# Altium footprint library mainLib.PcbLib: 169 footprints (part 6 of 11)
Each footprint in its own frame and in the unit in brackets; x right, y up, seen from the top. Pads: shape width x height; smd on the part's side, far side on the other; paste and mask are expansions set on the pad; w line width, h text height; cw(c..) or ccw(c..) is an arc to the next point about the centre after c.
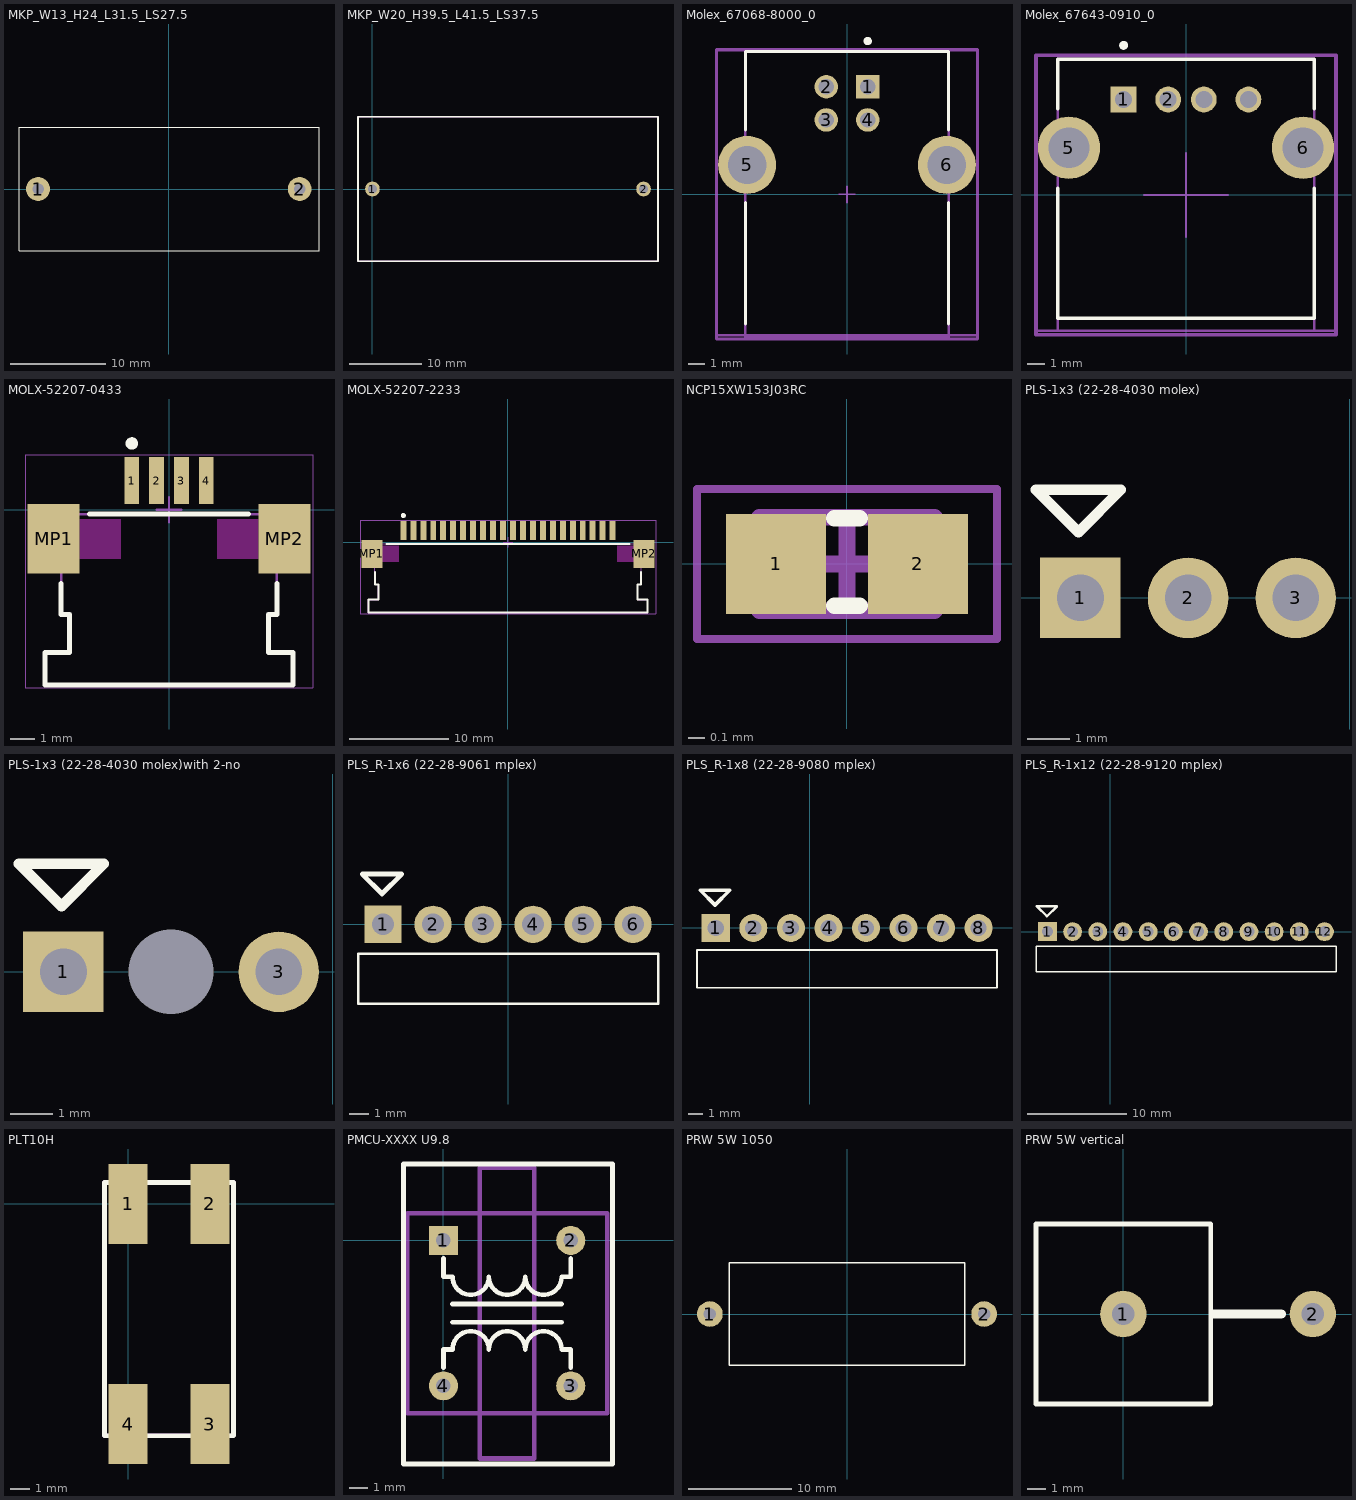
[diagram p5: the footprints below, top view; thin cyan lines are the x and y axes]

## MKP_W13_H24_L31.5_LS27.5 [mm]
pads (2):
  round 2.5 hole 1.2: 1(-13.735,0) 2(13.735,0)
Top Overlay:
  lines w0.127: -15.735,-6.5 -15.735,6.5 15.765,6.5 15.765,-6.5 -15.735,-6.5
3D body "MKP 31.5x13 h24 R27.5.STEP": height 24, standoff -2.54, extent -15.765,-6.5 15.735,6.5

## MKP_W20_H39.5_L41.5_LS37.5 [mil]
pads (2):
  round 80 hole 50: 1(0,0) 2(1476.38,0)
Top Overlay:
  lines w10: -78.74,-393.7 -78.74,-19.74 -78.74,393.7 1555.12,393.7 1555.12,-393.7 -78.74,-393.7
Mechanical 13:
  lines w10: -78.74,-393.7 -78.74,19.74 -78.74,393.7 1555.12,393.7 1555.12,-393.7 -78.74,-393.7
3D body: height 1555.12, standoff 0, extent -83.74,-398.7 1560.12,398.7

## Molex_67068-8000_0 [mm]
pads (6):
  rect 1.42x1.42 hole 0.92 paste-1000 mask+0: 1(1.25,6.49)
  round 1.42 hole 0.92 paste-1000 mask+0: 2(-1.25,6.49) 3(-1.25,4.49) 4(1.25,4.49)
  round 3.5 hole 2.3 paste-1000 mask+0: 5(-6.02,1.78) 6(6.02,1.78)
Top Overlay:
  circle w0.25: c1.25,9.25 r0.125
  lines w0.2: -6.125,-7.8 -6.125,-0.5 ; -6.125,3.905 -6.125,8.625 6.125,8.625 6.125,3.905 ; 6.125,-7.8 6.125,-0.5
Mechanical 10:
  lines w0.2: -7.87,-8.725 -7.87,8.725 7.87,8.725 7.87,-8.725 -7.87,-8.725
  text ".Designator" at 0,0 h1
Mechanical 12:
  lines w0.15: -7.87,-8.5 7.87,-8.5 ; -6.125,-8.625 -6.125,8.625 6.125,8.625 6.125,-8.625 -6.125,-8.625
Mechanical 15:
  lines w0.1: -0.5,0 0.5,0 ; 0,-0.5 0,0.5
  lines w0.2: -7.87,-8.725 -7.87,8.725 7.87,8.725 7.87,-8.725 -7.87,-8.725
3D body "Conn_Molex_67068-8000_eec.STEP": height 0.25, standoff 0, extent -7.87,-8.725 7.87,8.725

## Molex_67643-0910_0 [mm]
pads (6):
  rect 1.45x1.45 hole 0.95 paste-1000 mask+0: 1(-3.5,5.36)
  round 1.45 hole 0.95 paste-1000 mask+0: 2(-1,5.36) ""(1,5.36) ""(3.5,5.36)
  round 3.5 hole 2.3 paste-1000 mask+0: 5(-6.57,2.65) 6(6.57,2.65)
Top Overlay:
  circle w0.25: c-3.5,8.4 r0.125
  lines w0.2: -7.2,0.37 -7.2,-6.93 7.2,-6.93 7.2,0.37 ; -7.2,4.83 -7.2,7.63 7.2,7.63 7.2,4.83
Mechanical 10:
  lines w0.2: -8.42,-7.855 -8.42,7.855 8.42,7.855 8.42,-7.855 -8.42,-7.855
  text ".Designator" at 0,0 h1
Mechanical 12:
  lines w0.15: -8.42,-7.63 8.42,-7.63 ; -7.2,-7.63 -7.2,7.63 7.2,7.63 7.2,-7.63 -7.2,-7.63
Mechanical 15:
  lines w0.1: -2.357,0 2.357,0 ; 0,-2.357 0,2.357
  lines w0.2: -8.42,-7.855 -8.42,7.855 8.42,7.855 8.42,-7.855 -8.42,-7.855
3D body "3dmodel.step": height 0.25, standoff 0, extent -8.42,-7.855 8.42,7.855

## MOLX-52207-0433 [mm] "FPC Connector, 4-Leads, Right Angle, Pitch 1.0 mm, Mated Height 2.7 mm, SMT"
height 2.712
pads (6):
  rect 0.6x1.9 smd: 1(-1.5,1.175) 2(-0.5,1.175) 3(0.5,1.175) 4(1.5,1.175)
  rect 2.1x2.8 smd: MP1(-4.65,-1.175) MP2(4.65,-1.175)
Top Overlay:
  circle w0.25: c-1.5,2.675 r0.125
  lines w0.2: -4.35,-2.975 -4.35,-4.225 ; -3.2,-0.175 3.2,-0.175 ; 4.35,-2.975 4.35,-4.225 ; -4.35,-4.225 -4.013,-4.225 -4.012,-4.225 -4.012,-5.765 -5,-5.765 -5,-7.075 5,-7.075 5,-5.765 4.012,-5.765 4.012,-4.225 4.013,-4.225 4.35,-4.225 ; -4.35,-4.225 -4.35,-4.225 ; 4.35,-4.225 4.35,-4.225
Keep-Out Layer:
  region: -3.6,-0.375 -1.95,-0.375 -1.95,-1.975 -3.6,-1.975
  region: 3.6,-0.375 1.95,-0.375 1.95,-1.975 3.6,-1.975
Mechanical 13:
  lines w0.1: -5.15,-2.175 -5.15,-0.175 5.15,-0.175 5.15,-2.175 4.35,-2.175 4.35,-4.225 4.012,-4.225 4.012,-5.765 5,-5.765 5,-7.075 -5,-7.075 -5,-5.765 -4.012,-5.765 -4.012,-4.225 -4.35,-4.225 -4.35,-2.175 -5.15,-2.175
Mechanical 15:
  lines w0.05: -5.8,-7.175 -5.8,2.225 5.8,2.225 5.8,-7.175 -5.8,-7.175
  lines w0.1: -0.5,0 0.5,0 ; 0,-0.5 0,0.5
3D body "522070433.stp": height 2.71, standoff 0.01, extent -5.15,-7.075 5.15,1.825

## MOLX-52207-2233 [mm] "FPC Connector, 22-Leads, Right Angle, Pitch 1.0 mm, Mated Height 2.7 mm, SMT"
height 2.712
pads (24):
  rect 0.6x1.9 smd: 1(-10.5,1.175) 2(-9.5,1.175) 3(-8.5,1.175) 4(-7.5,1.175) 5(-6.5,1.175) 6(-5.5,1.175) 7(-4.5,1.175) 8(-3.5,1.175) 9(-2.5,1.175) 10(-1.5,1.175) 11(-0.5,1.175) 12(0.5,1.175) 13(1.5,1.175) 14(2.5,1.175) 15(3.5,1.175) 16(4.5,1.175) 17(5.5,1.175) 18(6.5,1.175) 19(7.5,1.175) 20(8.5,1.175) 21(9.5,1.175) 22(10.5,1.175)
  rect 2.1x2.8 smd: MP1(-13.65,-1.175) MP2(13.65,-1.175)
Top Overlay:
  circle w0.25: c-10.5,2.675 r0.125
  lines w0.2: -13.35,-2.975 -13.35,-4.225 -13.013,-4.225 -13.012,-5.765 -14,-5.765 -14,-7.075 14,-7.075 14,-5.765 13.012,-5.765 13.012,-4.225 13.35,-4.225 13.35,-2.975 ; -12.2,-0.175 12.2,-0.175
Keep-Out Layer:
  region: 12.6,-0.375 10.95,-0.375 10.95,-1.975 12.6,-1.975
  region: -12.6,-0.375 -10.95,-0.375 -10.95,-1.975 -12.6,-1.975
Mechanical 13:
  lines w0.1: -14.15,-2.175 -13.35,-2.175 -13.35,-4.225 -13.012,-4.225 -13.012,-5.765 -14,-5.765 -14,-7.075 14,-7.075 14,-5.765 13.012,-5.765 13.012,-4.225 13.35,-4.225 13.35,-2.175 14.15,-2.175 14.15,-0.175 -14.15,-0.175 -14.15,-2.175
Mechanical 15:
  lines w0.05: -14.8,-7.175 14.8,-7.175 14.8,2.225 -14.8,2.225 -14.8,-7.175
  lines w0.1: -0.5,0 0.5,0 ; 0,-0.5 0,0.5
3D body "522072233.stp": height 2.71, standoff 0.01, extent -14.15,-7.075 14.15,1.825

## NCP15XW153J03RC [mm]
height 0.56
pads (2):
  rect 0.6x0.6 smd: 1(-0.425,0) 2(0.425,0)
Top Overlay:
  lines w0.1: -0.075,-0.25 0.075,-0.25 ; -0.075,0.275 0.075,0.275
Mechanical 13:
  lines w0.1: -0.525,-0.28 0.525,-0.28 0.525,0.28 -0.525,0.28 -0.525,-0.28
Mechanical 15:
  lines w0.05: -0.9,-0.45 0.9,-0.45 0.9,0.45 -0.9,0.45 -0.9,-0.45
  lines w0.1: -0.28,0 0.28,0 ; 0,-0.28 0,0.28
3D body "NCP15XW153J03RC.step": height 0.56, standoff 0, extent -0.525,-0.28 0.525,0.28

## PLS-1x3 (22-28-4030 molex) [mm]
pads (3):
  rect 1.9x1.9 hole 1.1: 1(-6.35,0)
  round 1.9 hole 1.1: 2(-3.81,0) 3(-1.27,0)
Top Overlay:
  lines w0.254: -7.4,2.55 -5.4,2.55 -6.4,1.55 -7.4,2.55
3D body "022284030.stp": height 8.39, standoff -3.16, extent -7.62,-1.244 0,1.245

## PLS-1x3 (22-28-4030 molex)with 2-no [mm]
pads (3):
  rect 1.9x1.9 hole 1.1: 1(-6.35,0)
  round 0 hole 2 unplated: 2(-3.81,0)
  round 1.9 hole 1.1: 3(-1.27,0)
Top Overlay:
  lines w0.254: -7.4,2.55 -6.4,1.55 -5.4,2.55 -7.4,2.55
3D body "022284030.stp": height 8.39, standoff -3.16, extent -7.62,-1.244 0,1.245

## PLS_R-1x6 (22-28-9061 mplex) [mm]
pads (6):
  rect 1.9x1.9 hole 1.1: 1(-6.35,0)
  round 1.9 hole 1.1: 2(-3.81,0) 3(-1.27,0) 4(1.27,0) 5(3.81,0) 6(6.35,0)
Top Overlay:
  lines w0.127: -7.62,-4.04 7.62,-4.04 7.62,-1.5 -7.62,-1.5 -7.62,-4.04
  lines w0.254: -7.4,2.55 -6.4,1.55 -5.4,2.55 -7.4,2.55
3D body "022289061.stp": height 2.5, standoff -3.42, extent -7.62,-12.293 7.62,0.521

## PLS_R-1x8 (22-28-9080 mplex) [mm]
pads (8):
  rect 1.9x1.9 hole 1.1: 1(-6.35,0)
  round 1.9 hole 1.1: 2(-3.81,0) 3(-1.27,0) 4(1.27,0) 5(3.81,0) 6(6.35,0) 7(8.89,0) 8(11.43,0)
Top Overlay:
  lines w0.127: -7.62,-4.04 -7.62,-1.5 12.675,-1.5 12.675,-4.04 -7.62,-4.04
  lines w0.254: -7.4,2.55 -6.4,1.55 -5.4,2.55 -7.4,2.55
3D body "022289080.stp": height 2.5, standoff -3.42, extent -7.62,-10.261 12.7,0.521

## PLS_R-1x12 (22-28-9120 mplex) [mm]
pads (12):
  rect 1.9x1.9 hole 1.1: 1(-6.35,0)
  round 1.9 hole 1.1: 2(-3.81,0) 3(-1.27,0) 4(1.27,0) 5(3.81,0) 6(6.35,0) 7(8.89,0) 8(11.43,0) 9(13.97,0) 10(16.51,0) 11(19.05,0) 12(21.59,0)
Top Overlay:
  lines w0.127: -7.5,-4.04 -7.5,-1.5 22.75,-1.5 22.75,-4.04 -7.5,-4.04
  lines w0.254: -7.4,2.55 -6.4,1.55 -5.4,2.55 -7.4,2.55
3D body "022289120.stp": height 2.5, standoff -3.42, extent -7.62,-10.261 22.86,0.507

## PLT10H [mm]
pads (4):
  rect 2x4.1 smd: 1(0,0) 2(4.2,0) 3(4.2,-11.3) 4(0,-11.3)
Top Overlay:
  lines w0.254: -1.2,-11.9 -1.2,1.1 5.4,1.1 5.4,-11.9 -1.2,-11.9
Mechanical 13:
  lines w0.254: -1.2,-11.9 5.3,-11.9 5.4,-11.8 5.4,1.1 -1.2,1.1 -1.2,-11.9
3D body: height 9.4, standoff 0, extent -1.327,-12.027 5.527,1.227

## PMCU-XXXX U9.8 [mm]
pads (4):
  rect 1.6x1.6 hole 0.8: 1(0,0)
  round 1.6 hole 0.8: 2(7,0) 3(7,-8) 4(0,-8)
Top Overlay:
  lines w0.254: 0,-7 0,-6 0.5,-6 ; 0,-1 0,-2 0.5,-2 ; 0.5,-4.5 6.5,-4.5 ; 0.5,-3.5 6.5,-3.5 ; 2.5,-2 cw(c1.5,-2) 0.5,-2 ; 2.5,-2 ccw(c3.5,-2) 4.5,-2 ccw(c5.5,-2) 6.5,-2 7,-2 ; 7,-7 7,-6 6.5,-6 ccw(c5.5,-6) 4.5,-6 ccw(c3.5,-6) 2.5,-6 ccw(c1.5,-6) 0.5,-6 ; 7,-1 7,-2 ; 0.5,-6 0.5,-6 ; 0.5,-2 0.5,-2 ; 0.5,-2 0.5,-2 ; 7,-2 7,-2 ; -2.2,-12.3 9.3,-12.3 9.3,4.2 -2.2,4.2 -2.2,-12.3
Mechanical 13:
  lines w0.254: -2,-9.5 9,-9.5 9,1.5 -2,1.5 -2,-9.5 ; 2,-12 2,4 5,4 5,-12 2,-12
3D body: height 13.5, standoff 0, extent -1.999,-9.499 1.999,1.499
3D body: height 16.5, standoff 5, extent 2.001,-11.999 4.999,-9.501
3D body: height 13.5, standoff 0, extent 5.001,-9.499 8.999,1.499
3D body: height 16.5, standoff 5, extent 2.001,1.501 4.999,3.999
3D body: height 13.5, standoff 0, extent 2.001,-9.499 4.999,1.499
3D body: height 16.5, standoff 13.5, extent 2.001,-9.499 4.999,1.499
3D body: height 2, standoff 0, extent -2.127,-12.127 9.127,4.127

## PRW 5W 1050 [mm]
pads (2):
  round 2.5 hole 1.2: 1(-13.335,0) 2(13.335,0)
Top Overlay:
  lines w0.127: -11.43,-5 -11.43,5 11.43,5 11.43,-5 -11.43,-5
3D body "Res-(5W)-1050.STEP": height 10.01, standoff -2.62, extent -13.785,-5 13.785,5

## PRW 5W vertical [mm]
pads (2):
  round 2.5 hole 1.2: 1(0,0) 2(10.2,0)
Top Overlay:
  lines w0.254: -4.7,-4.85 4.7,-4.85 4.7,4.85 -4.7,4.85 -4.7,-4.85
  lines w0.5: 4.875,0 8.5,0
3D body "SQP-5W_Vert.STEP": height 24.3, standoff -4, extent -4.7,-4.85 10.66,4.85